# Altium integrated library Samtec 2 mm Pitch Terminal Strips.IntLib: 623 symbols (part 4 of 5) (continued)
## TW-10-03-F-D-200-SM (continued)
SMT Board Stacker, Vertical, -55 to 125 degC, 2 mm Pitch, 20-Pin, Male, RoHS; Manufacturer: Samtec; PartNumber: TW-10-03-F-D-200-SM; Pitch: 2 mm; DatasheetVersion: F-214; PackageVersion: CL, 3/1993; PackageReference: TW-10-03-X-D-200-SM; PackageDescription: High Temp 2mm SMT Board Stacking Terminal Strip ASM; Orientation: Vertical; RoHS: True; Temperature Range: -55 to 125 degC; Mounting Technology: Surface Mount; ComponentLink1Description: Manufacturer URL; ComponentLink1URL: http://www.samtec.com; ComponentLink2Description: Datasheet; ComponentLink2URL: http://d2a072wq521u33.cloudfront.net/catalog_english//TW_SM.PDF; ComponentLink3Description: Package Specification; ComponentLink3URL: http://www.samtec.com/documents/webfiles/cpdf/TW-XX-XX-XXX-X-XXX-SM-XXX-XX-MKT1.pdf
footprint SMTC-TW-10-03-X-D-200-SM (SMT Board Stacking Terminal Strip ASM, 2x10 Pins, Vertical, 2mm Pitch, Male)
pins: 1, 2, 3, 4, 5, 6, 7, 8, 9, 10, 11, 12, 13, 14, 15, 16, 17, 18, 19, 20

## TW-10-03-F-D-236-157
designator P?
Through-Hole Board Stacker, Vertical, -55 to 125 degC, 2 mm Pitch, 20-Pin, Male, RoHS; Manufacturer: Samtec; PartNumber: TW-10-03-F-D-236-157; Pitch: 2 mm; DatasheetVersion: F-214; PackageVersion: BF, 6/1998; PackageReference: TW-10-03-X-D-236-157; PackageDescription: High Temp 2mm Terminal Strip(Board Stacking); Orientation: Vertical; RoHS: True; Temperature Range: -55 to 125 degC; Mounting Technology: Through-hole; ComponentLink1Description: Manufacturer URL; ComponentLink1URL: http://www.samtec.com; ComponentLink2Description: Datasheet; ComponentLink2URL: http://d2a072wq521u33.cloudfront.net/catalog_english//TW_TH.PDF; ComponentLink3Description: Package Specification; ComponentLink3URL: http://www.samtec.com/documents/webfiles/cpdf/TW-XX-XX-X-X-XXX-XXX-XXX-XX-MKT2.pdf
footprint SMTC-TW-10-03-X-D-236-157 (Terminal Strip, 2x10 Pins, Vertical, 2mm Pitch, Male)
pins: 1, 2, 3, 4, 5, 6, 7, 8, 9, 10, 11, 12, 13, 14, 15, 16, 17, 18, 19, 20

## TW-10-03-L-D-200-SM
designator P?
SMT Board Stacker, Vertical, -55 to 125 degC, 2 mm Pitch, 20-Pin, Male, RoHS; Manufacturer: Samtec; PartNumber: TW-10-03-L-D-200-SM; Pitch: 2 mm; DatasheetVersion: F-214; PackageVersion: CL, 3/1993; PackageReference: TW-10-03-X-D-200-SM; PackageDescription: High Temp 2mm SMT Board Stacking Terminal Strip ASM; Orientation: Vertical; RoHS: True; Temperature Range: -55 to 125 degC; Mounting Technology: Surface Mount; ComponentLink1Description: Manufacturer URL; ComponentLink1URL: http://www.samtec.com; ComponentLink2Description: Datasheet; ComponentLink2URL: http://d2a072wq521u33.cloudfront.net/catalog_english//TW_SM.PDF; ComponentLink3Description: Package Specification; ComponentLink3URL: http://www.samtec.com/documents/webfiles/cpdf/TW-XX-XX-XXX-X-XXX-SM-XXX-XX-MKT1.pdf
footprint SMTC-TW-10-03-X-D-200-SM (SMT Board Stacking Terminal Strip ASM, 2x10 Pins, Vertical, 2mm Pitch, Male)
pins: 1, 2, 3, 4, 5, 6, 7, 8, 9, 10, 11, 12, 13, 14, 15, 16, 17, 18, 19, 20

## TW-10-03-L-D-236-157
designator P?
Through-Hole Board Stacker, Vertical, -55 to 125 degC, 2 mm Pitch, 20-Pin, Male, RoHS; Manufacturer: Samtec; PartNumber: TW-10-03-L-D-236-157; Pitch: 2 mm; DatasheetVersion: F-214; PackageVersion: BF, 6/1998; PackageReference: TW-10-03-X-D-236-157; PackageDescription: High Temp 2mm Terminal Strip(Board Stacking); Orientation: Vertical; RoHS: True; Temperature Range: -55 to 125 degC; Mounting Technology: Through-hole; ComponentLink1Description: Manufacturer URL; ComponentLink1URL: http://www.samtec.com; ComponentLink2Description: Datasheet; ComponentLink2URL: http://d2a072wq521u33.cloudfront.net/catalog_english//TW_TH.PDF; ComponentLink3Description: Package Specification; ComponentLink3URL: http://www.samtec.com/documents/webfiles/cpdf/TW-XX-XX-X-X-XXX-XXX-XXX-XX-MKT2.pdf
footprint SMTC-TW-10-03-X-D-236-157 (Terminal Strip, 2x10 Pins, Vertical, 2mm Pitch, Male)
pins: 1, 2, 3, 4, 5, 6, 7, 8, 9, 10, 11, 12, 13, 14, 15, 16, 17, 18, 19, 20

## TW-10-03-T-D-200-SM
designator P?
SMT Board Stacker, Vertical, -55 to 105 degC, 2 mm Pitch, 20-Pin, Male, RoHS; Manufacturer: Samtec; PartNumber: TW-10-03-T-D-200-SM; Pitch: 2 mm; DatasheetVersion: F-214; PackageVersion: CL, 3/1993; PackageReference: TW-10-03-X-D-200-SM; PackageDescription: High Temp 2mm SMT Board Stacking Terminal Strip ASM; Orientation: Vertical; RoHS: True; Temperature Range: -55 to 105 degC; Mounting Technology: Surface Mount; ComponentLink1Description: Manufacturer URL; ComponentLink1URL: http://www.samtec.com; ComponentLink2Description: Datasheet; ComponentLink2URL: http://d2a072wq521u33.cloudfront.net/catalog_english//TW_SM.PDF; ComponentLink3Description: Package Specification; ComponentLink3URL: http://www.samtec.com/documents/webfiles/cpdf/TW-XX-XX-XXX-X-XXX-SM-XXX-XX-MKT1.pdf
footprint SMTC-TW-10-03-X-D-200-SM (SMT Board Stacking Terminal Strip ASM, 2x10 Pins, Vertical, 2mm Pitch, Male)
pins: 1, 2, 3, 4, 5, 6, 7, 8, 9, 10, 11, 12, 13, 14, 15, 16, 17, 18, 19, 20

## TW-10-03-T-D-236-157
designator P?
Through-Hole Board Stacker, Vertical, -55 to 105 degC, 2 mm Pitch, 20-Pin, Male, RoHS; Manufacturer: Samtec; PartNumber: TW-10-03-T-D-236-157; Pitch: 2 mm; DatasheetVersion: F-214; PackageVersion: BF, 6/1998; PackageReference: TW-10-03-X-D-236-157; PackageDescription: High Temp 2mm Terminal Strip(Board Stacking); Orientation: Vertical; RoHS: True; Temperature Range: -55 to 105 degC; Mounting Technology: Through-hole; ComponentLink1Description: Manufacturer URL; ComponentLink1URL: http://www.samtec.com; ComponentLink2Description: Datasheet; ComponentLink2URL: http://d2a072wq521u33.cloudfront.net/catalog_english//TW_TH.PDF; ComponentLink3Description: Package Specification; ComponentLink3URL: http://www.samtec.com/documents/webfiles/cpdf/TW-XX-XX-X-X-XXX-XXX-XXX-XX-MKT2.pdf
footprint SMTC-TW-10-03-X-D-236-157 (Terminal Strip, 2x10 Pins, Vertical, 2mm Pitch, Male)
pins: 1, 2, 3, 4, 5, 6, 7, 8, 9, 10, 11, 12, 13, 14, 15, 16, 17, 18, 19, 20

## TW-10-06-F-Q-370-105
designator P?
Through-Hole Board Stacker, Vertical, -55 to 125 degC, 2 mm Pitch, 40-Pin, Male, RoHS; Manufacturer: Samtec; PartNumber: TW-10-06-F-Q-370-105; Pitch: 2 mm; DatasheetVersion: F-214; PackageVersion: BF, 6/1998; PackageReference: TW-10-06-X-Q-370-105; PackageDescription: High Temp 2mm Terminal Strip(Board Stacking); Orientation: Vertical; RoHS: True; Temperature Range: -55 to 125 degC; Mounting Technology: Through-hole; ComponentLink1Description: Manufacturer URL; ComponentLink1URL: http://www.samtec.com; ComponentLink2Description: Datasheet; ComponentLink2URL: http://d2a072wq521u33.cloudfront.net/catalog_english//TW_TH.PDF; ComponentLink3Description: Package Specification; ComponentLink3URL: http://www.samtec.com/documents/webfiles/cpdf/TW-XX-XX-X-X-XXX-XXX-XXX-XX-MKT2.pdf
footprint SMTC-TW-10-06-X-Q-370-105 (Terminal Strip, 4x10 Pins, Vertical, 2mm Pitch, Male)
pins: 1, 2, 3, 4, 5, 6, 7, 8, 9, 10, 11, 12, 13, 14, 15, 16, 17, 18, 19, 20, 21, 22, 23, 24, 25, 26, 27, 28, 29, 30, 31, 32, 33, 34, 35, 36, 37, 38, 39, 40

## TW-10-06-L-Q-370-105
designator P?
Through-Hole Board Stacker, Vertical, -55 to 125 degC, 2 mm Pitch, 40-Pin, Male, RoHS; Manufacturer: Samtec; PartNumber: TW-10-06-L-Q-370-105; Pitch: 2 mm; DatasheetVersion: F-214; PackageVersion: BF, 6/1998; PackageReference: TW-10-06-X-Q-370-105; PackageDescription: High Temp 2mm Terminal Strip(Board Stacking); Orientation: Vertical; RoHS: True; Temperature Range: -55 to 125 degC; Mounting Technology: Through-hole; ComponentLink1Description: Manufacturer URL; ComponentLink1URL: http://www.samtec.com; ComponentLink2Description: Datasheet; ComponentLink2URL: http://d2a072wq521u33.cloudfront.net/catalog_english//TW_TH.PDF; ComponentLink3Description: Package Specification; ComponentLink3URL: http://www.samtec.com/documents/webfiles/cpdf/TW-XX-XX-X-X-XXX-XXX-XXX-XX-MKT2.pdf
footprint SMTC-TW-10-06-X-Q-370-105 (Terminal Strip, 4x10 Pins, Vertical, 2mm Pitch, Male)
pins: 1, 2, 3, 4, 5, 6, 7, 8, 9, 10, 11, 12, 13, 14, 15, 16, 17, 18, 19, 20, 21, 22, 23, 24, 25, 26, 27, 28, 29, 30, 31, 32, 33, 34, 35, 36, 37, 38, 39, 40

## TW-10-06-T-Q-370-105
designator P?
Through-Hole Board Stacker, Vertical, -55 to 105 degC, 2 mm Pitch, 40-Pin, Male, RoHS; Manufacturer: Samtec; PartNumber: TW-10-06-T-Q-370-105; Pitch: 2 mm; DatasheetVersion: F-214; PackageVersion: BF, 6/1998; PackageReference: TW-10-06-X-Q-370-105; PackageDescription: High Temp 2mm Terminal Strip(Board Stacking); Orientation: Vertical; RoHS: True; Temperature Range: -55 to 105 degC; Mounting Technology: Through-hole; ComponentLink1Description: Manufacturer URL; ComponentLink1URL: http://www.samtec.com; ComponentLink2Description: Datasheet; ComponentLink2URL: http://d2a072wq521u33.cloudfront.net/catalog_english//TW_TH.PDF; ComponentLink3Description: Package Specification; ComponentLink3URL: http://www.samtec.com/documents/webfiles/cpdf/TW-XX-XX-X-X-XXX-XXX-XXX-XX-MKT2.pdf
footprint SMTC-TW-10-06-X-Q-370-105 (Terminal Strip, 4x10 Pins, Vertical, 2mm Pitch, Male)
pins: 1, 2, 3, 4, 5, 6, 7, 8, 9, 10, 11, 12, 13, 14, 15, 16, 17, 18, 19, 20, 21, 22, 23, 24, 25, 26, 27, 28, 29, 30, 31, 32, 33, 34, 35, 36, 37, 38, 39, 40

## TW-10-09-F-6-160-100
designator P?
Through-Hole Board Stacker, Vertical, -55 to 125 degC, 2 mm Pitch, 60-Pin, Male, RoHS; Manufacturer: Samtec; PartNumber: TW-10-09-F-6-160-100; Pitch: 2 mm; DatasheetVersion: F-214; PackageVersion: BF, 6/1998; PackageReference: TW-10-09-X-6-160-100; PackageDescription: High Temp 2mm Terminal Strip(Board Stacking); Orientation: Vertical; RoHS: True; Temperature Range: -55 to 125 degC; Mounting Technology: Through-hole; ComponentLink1Description: Manufacturer URL; ComponentLink1URL: http://www.samtec.com; ComponentLink2Description: Datasheet; ComponentLink2URL: http://d2a072wq521u33.cloudfront.net/catalog_english//TW_TH.PDF; ComponentLink3Description: Package Specification; ComponentLink3URL: http://www.samtec.com/documents/webfiles/cpdf/TW-XX-XX-X-X-XXX-XXX-XXX-XX-MKT2.pdf
footprint SMTC-TW-10-09-X-6-160-100 (Terminal Strip, 6x10 Pins, Vertical, 2mm Pitch, Male)
pins: 1, 2, 3, 4, 5, 6, 7, 8, 9, 10, 11, 12, 13, 14, 15, 16, 17, 18, 19, 20, 21, 22, 23, 24, 25, 26, 27, 28, 29, 30, 31, 32, 33, 34, 35, 36, 37, 38, 39, 40, 41, 42, 43, 44, 45, 46, 47, 48, 49, 50, 51, 52, 53, 54, 55, 56, 57, 58, 59, 60

## TW-10-09-F-D-260-SM-P
designator P?
SMT Board Stacker, Vertical, -55 to 125 degC, 2 mm Pitch, 20-Pin, Male, RoHS; Manufacturer: Samtec; PartNumber: TW-10-09-F-D-260-SM-P; Pitch: 2 mm; DatasheetVersion: F-214; PackageVersion: CL, 3/1993; PackageReference: TW-10-09-X-D-260-SM-P; PackageDescription: High Temp 2mm SMT Board Stacking Terminal Strip ASM; Orientation: Vertical; RoHS: True; Temperature Range: -55 to 125 degC; Mounting Technology: Surface Mount; ComponentLink1Description: Manufacturer URL; ComponentLink1URL: http://www.samtec.com; ComponentLink2Description: Datasheet; ComponentLink2URL: http://d2a072wq521u33.cloudfront.net/catalog_english//TW_SM.PDF; ComponentLink3Description: Package Specification; ComponentLink3URL: http://www.samtec.com/documents/webfiles/cpdf/TW-XX-XX-XXX-X-XXX-SM-XXX-XX-MKT1.pdf
footprint SMTC-TW-10-09-X-D-260-SM-P (SMT Board Stacking Terminal Strip ASM, 2x10 Pins, Vertical, 2mm Pitch, Male)
pins: 1, 2, 3, 4, 5, 6, 7, 8, 9, 10, 11, 12, 13, 14, 15, 16, 17, 18, 19, 20

## TW-10-09-L-6-160-100
designator P?
Through-Hole Board Stacker, Vertical, -55 to 125 degC, 2 mm Pitch, 60-Pin, Male, RoHS; Manufacturer: Samtec; PartNumber: TW-10-09-L-6-160-100; Pitch: 2 mm; DatasheetVersion: F-214; PackageVersion: BF, 6/1998; PackageReference: TW-10-09-X-6-160-100; PackageDescription: High Temp 2mm Terminal Strip(Board Stacking); Orientation: Vertical; RoHS: True; Temperature Range: -55 to 125 degC; Mounting Technology: Through-hole; ComponentLink1Description: Manufacturer URL; ComponentLink1URL: http://www.samtec.com; ComponentLink2Description: Datasheet; ComponentLink2URL: http://d2a072wq521u33.cloudfront.net/catalog_english//TW_TH.PDF; ComponentLink3Description: Package Specification; ComponentLink3URL: http://www.samtec.com/documents/webfiles/cpdf/TW-XX-XX-X-X-XXX-XXX-XXX-XX-MKT2.pdf
footprint SMTC-TW-10-09-X-6-160-100 (Terminal Strip, 6x10 Pins, Vertical, 2mm Pitch, Male)
pins: 1, 2, 3, 4, 5, 6, 7, 8, 9, 10, 11, 12, 13, 14, 15, 16, 17, 18, 19, 20, 21, 22, 23, 24, 25, 26, 27, 28, 29, 30, 31, 32, 33, 34, 35, 36, 37, 38, 39, 40, 41, 42, 43, 44, 45, 46, 47, 48, 49, 50, 51, 52, 53, 54, 55, 56, 57, 58, 59, 60

## TW-10-09-L-D-260-SM-P
designator P?
SMT Board Stacker, Vertical, -55 to 125 degC, 2 mm Pitch, 20-Pin, Male, RoHS; Manufacturer: Samtec; PartNumber: TW-10-09-L-D-260-SM-P; Pitch: 2 mm; DatasheetVersion: F-214; PackageVersion: CL, 3/1993; PackageReference: TW-10-09-X-D-260-SM-P; PackageDescription: High Temp 2mm SMT Board Stacking Terminal Strip ASM; Orientation: Vertical; RoHS: True; Temperature Range: -55 to 125 degC; Mounting Technology: Surface Mount; ComponentLink1Description: Manufacturer URL; ComponentLink1URL: http://www.samtec.com; ComponentLink2Description: Datasheet; ComponentLink2URL: http://d2a072wq521u33.cloudfront.net/catalog_english//TW_SM.PDF; ComponentLink3Description: Package Specification; ComponentLink3URL: http://www.samtec.com/documents/webfiles/cpdf/TW-XX-XX-XXX-X-XXX-SM-XXX-XX-MKT1.pdf
footprint SMTC-TW-10-09-X-D-260-SM-P (SMT Board Stacking Terminal Strip ASM, 2x10 Pins, Vertical, 2mm Pitch, Male)
pins: 1, 2, 3, 4, 5, 6, 7, 8, 9, 10, 11, 12, 13, 14, 15, 16, 17, 18, 19, 20

## TW-10-09-T-6-160-100
designator P?
Through-Hole Board Stacker, Vertical, -55 to 105 degC, 2 mm Pitch, 60-Pin, Male, RoHS; Manufacturer: Samtec; PartNumber: TW-10-09-T-6-160-100; Pitch: 2 mm; DatasheetVersion: F-214; PackageVersion: BF, 6/1998; PackageReference: TW-10-09-X-6-160-100; PackageDescription: High Temp 2mm Terminal Strip(Board Stacking); Orientation: Vertical; RoHS: True; Temperature Range: -55 to 105 degC; Mounting Technology: Through-hole; ComponentLink1Description: Manufacturer URL; ComponentLink1URL: http://www.samtec.com; ComponentLink2Description: Datasheet; ComponentLink2URL: http://d2a072wq521u33.cloudfront.net/catalog_english//TW_TH.PDF; ComponentLink3Description: Package Specification; ComponentLink3URL: http://www.samtec.com/documents/webfiles/cpdf/TW-XX-XX-X-X-XXX-XXX-XXX-XX-MKT2.pdf
footprint SMTC-TW-10-09-X-6-160-100 (Terminal Strip, 6x10 Pins, Vertical, 2mm Pitch, Male)
pins: 1, 2, 3, 4, 5, 6, 7, 8, 9, 10, 11, 12, 13, 14, 15, 16, 17, 18, 19, 20, 21, 22, 23, 24, 25, 26, 27, 28, 29, 30, 31, 32, 33, 34, 35, 36, 37, 38, 39, 40, 41, 42, 43, 44, 45, 46, 47, 48, 49, 50, 51, 52, 53, 54, 55, 56, 57, 58, 59, 60

## TW-10-09-T-D-260-SM-P
designator P?
SMT Board Stacker, Vertical, -55 to 105 degC, 2 mm Pitch, 20-Pin, Male, RoHS; Manufacturer: Samtec; PartNumber: TW-10-09-T-D-260-SM-P; Pitch: 2 mm; DatasheetVersion: F-214; PackageVersion: CL, 3/1993; PackageReference: TW-10-09-X-D-260-SM-P; PackageDescription: High Temp 2mm SMT Board Stacking Terminal Strip ASM; Orientation: Vertical; RoHS: True; Temperature Range: -55 to 105 degC; Mounting Technology: Surface Mount; ComponentLink1Description: Manufacturer URL; ComponentLink1URL: http://www.samtec.com; ComponentLink2Description: Datasheet; ComponentLink2URL: http://d2a072wq521u33.cloudfront.net/catalog_english//TW_SM.PDF; ComponentLink3Description: Package Specification; ComponentLink3URL: http://www.samtec.com/documents/webfiles/cpdf/TW-XX-XX-XXX-X-XXX-SM-XXX-XX-MKT1.pdf
footprint SMTC-TW-10-09-X-D-260-SM-P (SMT Board Stacking Terminal Strip ASM, 2x10 Pins, Vertical, 2mm Pitch, Male)
pins: 1, 2, 3, 4, 5, 6, 7, 8, 9, 10, 11, 12, 13, 14, 15, 16, 17, 18, 19, 20

## TW-10-10-F-D-355-195
designator P?
Through-Hole Board Stacker, Vertical, -55 to 125 degC, 2 mm Pitch, 20-Pin, Male, RoHS; Manufacturer: Samtec; PartNumber: TW-10-10-F-D-355-195; Pitch: 2 mm; DatasheetVersion: F-214; PackageVersion: BF, 6/1998; PackageReference: TW-10-10-X-D-355-195; PackageDescription: High Temp 2mm Terminal Strip(Board Stacking); Orientation: Vertical; RoHS: True; Temperature Range: -55 to 125 degC; Mounting Technology: Through-hole; ComponentLink1Description: Manufacturer URL; ComponentLink1URL: http://www.samtec.com; ComponentLink2Description: Datasheet; ComponentLink2URL: http://d2a072wq521u33.cloudfront.net/catalog_english//TW_TH.PDF; ComponentLink3Description: Package Specification; ComponentLink3URL: http://www.samtec.com/documents/webfiles/cpdf/TW-XX-XX-X-X-XXX-XXX-XXX-XX-MKT2.pdf
footprint SMTC-TW-10-10-X-D-355-195 (Terminal Strip, 2x10 Pins, Vertical, 2mm Pitch, Male)
pins: 1, 2, 3, 4, 5, 6, 7, 8, 9, 10, 11, 12, 13, 14, 15, 16, 17, 18, 19, 20

## TW-10-10-L-D-355-195
designator P?
Through-Hole Board Stacker, Vertical, -55 to 125 degC, 2 mm Pitch, 20-Pin, Male, RoHS; Manufacturer: Samtec; PartNumber: TW-10-10-L-D-355-195; Pitch: 2 mm; DatasheetVersion: F-214; PackageVersion: BF, 6/1998; PackageReference: TW-10-10-X-D-355-195; PackageDescription: High Temp 2mm Terminal Strip(Board Stacking); Orientation: Vertical; RoHS: True; Temperature Range: -55 to 125 degC; Mounting Technology: Through-hole; ComponentLink1Description: Manufacturer URL; ComponentLink1URL: http://www.samtec.com; ComponentLink2Description: Datasheet; ComponentLink2URL: http://d2a072wq521u33.cloudfront.net/catalog_english//TW_TH.PDF; ComponentLink3Description: Package Specification; ComponentLink3URL: http://www.samtec.com/documents/webfiles/cpdf/TW-XX-XX-X-X-XXX-XXX-XXX-XX-MKT2.pdf
footprint SMTC-TW-10-10-X-D-355-195 (Terminal Strip, 2x10 Pins, Vertical, 2mm Pitch, Male)
pins: 1, 2, 3, 4, 5, 6, 7, 8, 9, 10, 11, 12, 13, 14, 15, 16, 17, 18, 19, 20

## TW-10-10-T-D-355-195
designator P?
Through-Hole Board Stacker, Vertical, -55 to 105 degC, 2 mm Pitch, 20-Pin, Male, RoHS; Manufacturer: Samtec; PartNumber: TW-10-10-T-D-355-195; Pitch: 2 mm; DatasheetVersion: F-214; PackageVersion: BF, 6/1998; PackageReference: TW-10-10-X-D-355-195; PackageDescription: High Temp 2mm Terminal Strip(Board Stacking); Orientation: Vertical; RoHS: True; Temperature Range: -55 to 105 degC; Mounting Technology: Through-hole; ComponentLink1Description: Manufacturer URL; ComponentLink1URL: http://www.samtec.com; ComponentLink2Description: Datasheet; ComponentLink2URL: http://d2a072wq521u33.cloudfront.net/catalog_english//TW_TH.PDF; ComponentLink3Description: Package Specification; ComponentLink3URL: http://www.samtec.com/documents/webfiles/cpdf/TW-XX-XX-X-X-XXX-XXX-XXX-XX-MKT2.pdf
footprint SMTC-TW-10-10-X-D-355-195 (Terminal Strip, 2x10 Pins, Vertical, 2mm Pitch, Male)
pins: 1, 2, 3, 4, 5, 6, 7, 8, 9, 10, 11, 12, 13, 14, 15, 16, 17, 18, 19, 20

## TW-10-12-F-D-830-090
designator P?
Through-Hole Board Stacker, Vertical, -55 to 125 degC, 2 mm Pitch, 20-Pin, Male, RoHS; Manufacturer: Samtec; PartNumber: TW-10-12-F-D-830-090; Pitch: 2 mm; DatasheetVersion: F-214; PackageVersion: BF, 6/1998; PackageReference: TW-10-12-X-D-830-090; PackageDescription: High Temp 2mm Terminal Strip(Board Stacking); Orientation: Vertical; RoHS: True; Temperature Range: -55 to 125 degC; Mounting Technology: Through-hole; ComponentLink1Description: Manufacturer URL; ComponentLink1URL: http://www.samtec.com; ComponentLink2Description: Datasheet; ComponentLink2URL: http://d2a072wq521u33.cloudfront.net/catalog_english//TW_TH.PDF; ComponentLink3Description: Package Specification; ComponentLink3URL: http://www.samtec.com/documents/webfiles/cpdf/TW-XX-XX-X-X-XXX-XXX-XXX-XX-MKT2.pdf
footprint SMTC-TW-10-12-X-D-830-090 (Terminal Strip, 2x10 Pins, Vertical, 2mm Pitch, Male)
pins: 1, 2, 3, 4, 5, 6, 7, 8, 9, 10, 11, 12, 13, 14, 15, 16, 17, 18, 19, 20

## TW-10-12-F-D-840-090
designator P?
Through-Hole Board Stacker, Vertical, -55 to 125 degC, 2 mm Pitch, 20-Pin, Male, RoHS; Manufacturer: Samtec; PartNumber: TW-10-12-F-D-840-090; Pitch: 2 mm; DatasheetVersion: F-214; PackageVersion: BF, 6/1998; PackageReference: TW-10-12-X-D-840-090; PackageDescription: High Temp 2mm Terminal Strip(Board Stacking); Orientation: Vertical; RoHS: True; Temperature Range: -55 to 125 degC; Mounting Technology: Through-hole; ComponentLink1Description: Manufacturer URL; ComponentLink1URL: http://www.samtec.com; ComponentLink2Description: Datasheet; ComponentLink2URL: http://d2a072wq521u33.cloudfront.net/catalog_english//TW_TH.PDF; ComponentLink3Description: Package Specification; ComponentLink3URL: http://www.samtec.com/documents/webfiles/cpdf/TW-XX-XX-X-X-XXX-XXX-XXX-XX-MKT2.pdf
footprint SMTC-TW-10-12-X-D-840-090 (Terminal Strip, 2x10 Pins, Vertical, 2mm Pitch, Male)
pins: 1, 2, 3, 4, 5, 6, 7, 8, 9, 10, 11, 12, 13, 14, 15, 16, 17, 18, 19, 20

## TW-10-12-L-D-830-090
designator P?
Through-Hole Board Stacker, Vertical, -55 to 125 degC, 2 mm Pitch, 20-Pin, Male, RoHS; Manufacturer: Samtec; PartNumber: TW-10-12-L-D-830-090; Pitch: 2 mm; DatasheetVersion: F-214; PackageVersion: BF, 6/1998; PackageReference: TW-10-12-X-D-830-090; PackageDescription: High Temp 2mm Terminal Strip(Board Stacking); Orientation: Vertical; RoHS: True; Temperature Range: -55 to 125 degC; Mounting Technology: Through-hole; ComponentLink1Description: Manufacturer URL; ComponentLink1URL: http://www.samtec.com; ComponentLink2Description: Datasheet; ComponentLink2URL: http://d2a072wq521u33.cloudfront.net/catalog_english//TW_TH.PDF; ComponentLink3Description: Package Specification; ComponentLink3URL: http://www.samtec.com/documents/webfiles/cpdf/TW-XX-XX-X-X-XXX-XXX-XXX-XX-MKT2.pdf
footprint SMTC-TW-10-12-X-D-830-090 (Terminal Strip, 2x10 Pins, Vertical, 2mm Pitch, Male)
pins: 1, 2, 3, 4, 5, 6, 7, 8, 9, 10, 11, 12, 13, 14, 15, 16, 17, 18, 19, 20

## TW-10-12-L-D-840-090
designator P?
Through-Hole Board Stacker, Vertical, -55 to 125 degC, 2 mm Pitch, 20-Pin, Male, RoHS; Manufacturer: Samtec; PartNumber: TW-10-12-L-D-840-090; Pitch: 2 mm; DatasheetVersion: F-214; PackageVersion: BF, 6/1998; PackageReference: TW-10-12-X-D-840-090; PackageDescription: High Temp 2mm Terminal Strip(Board Stacking); Orientation: Vertical; RoHS: True; Temperature Range: -55 to 125 degC; Mounting Technology: Through-hole; ComponentLink1Description: Manufacturer URL; ComponentLink1URL: http://www.samtec.com; ComponentLink2Description: Datasheet; ComponentLink2URL: http://d2a072wq521u33.cloudfront.net/catalog_english//TW_TH.PDF; ComponentLink3Description: Package Specification; ComponentLink3URL: http://www.samtec.com/documents/webfiles/cpdf/TW-XX-XX-X-X-XXX-XXX-XXX-XX-MKT2.pdf
footprint SMTC-TW-10-12-X-D-840-090 (Terminal Strip, 2x10 Pins, Vertical, 2mm Pitch, Male)
pins: 1, 2, 3, 4, 5, 6, 7, 8, 9, 10, 11, 12, 13, 14, 15, 16, 17, 18, 19, 20

## TW-10-12-T-D-830-090
designator P?
Through-Hole Board Stacker, Vertical, -55 to 105 degC, 2 mm Pitch, 20-Pin, Male, RoHS; Manufacturer: Samtec; PartNumber: TW-10-12-T-D-830-090; Pitch: 2 mm; DatasheetVersion: F-214; PackageVersion: BF, 6/1998; PackageReference: TW-10-12-X-D-830-090; PackageDescription: High Temp 2mm Terminal Strip(Board Stacking); Orientation: Vertical; RoHS: True; Temperature Range: -55 to 105 degC; Mounting Technology: Through-hole; ComponentLink1Description: Manufacturer URL; ComponentLink1URL: http://www.samtec.com; ComponentLink2Description: Datasheet; ComponentLink2URL: http://d2a072wq521u33.cloudfront.net/catalog_english//TW_TH.PDF; ComponentLink3Description: Package Specification; ComponentLink3URL: http://www.samtec.com/documents/webfiles/cpdf/TW-XX-XX-X-X-XXX-XXX-XXX-XX-MKT2.pdf
footprint SMTC-TW-10-12-X-D-830-090 (Terminal Strip, 2x10 Pins, Vertical, 2mm Pitch, Male)
pins: 1, 2, 3, 4, 5, 6, 7, 8, 9, 10, 11, 12, 13, 14, 15, 16, 17, 18, 19, 20

## TW-10-12-T-D-840-090
designator P?
Through-Hole Board Stacker, Vertical, -55 to 105 degC, 2 mm Pitch, 20-Pin, Male, RoHS; Manufacturer: Samtec; PartNumber: TW-10-12-T-D-840-090; Pitch: 2 mm; DatasheetVersion: F-214; PackageVersion: BF, 6/1998; PackageReference: TW-10-12-X-D-840-090; PackageDescription: High Temp 2mm Terminal Strip(Board Stacking); Orientation: Vertical; RoHS: True; Temperature Range: -55 to 105 degC; Mounting Technology: Through-hole; ComponentLink1Description: Manufacturer URL; ComponentLink1URL: http://www.samtec.com; ComponentLink2Description: Datasheet; ComponentLink2URL: http://d2a072wq521u33.cloudfront.net/catalog_english//TW_TH.PDF; ComponentLink3Description: Package Specification; ComponentLink3URL: http://www.samtec.com/documents/webfiles/cpdf/TW-XX-XX-X-X-XXX-XXX-XXX-XX-MKT2.pdf
footprint SMTC-TW-10-12-X-D-840-090 (Terminal Strip, 2x10 Pins, Vertical, 2mm Pitch, Male)
pins: 1, 2, 3, 4, 5, 6, 7, 8, 9, 10, 11, 12, 13, 14, 15, 16, 17, 18, 19, 20

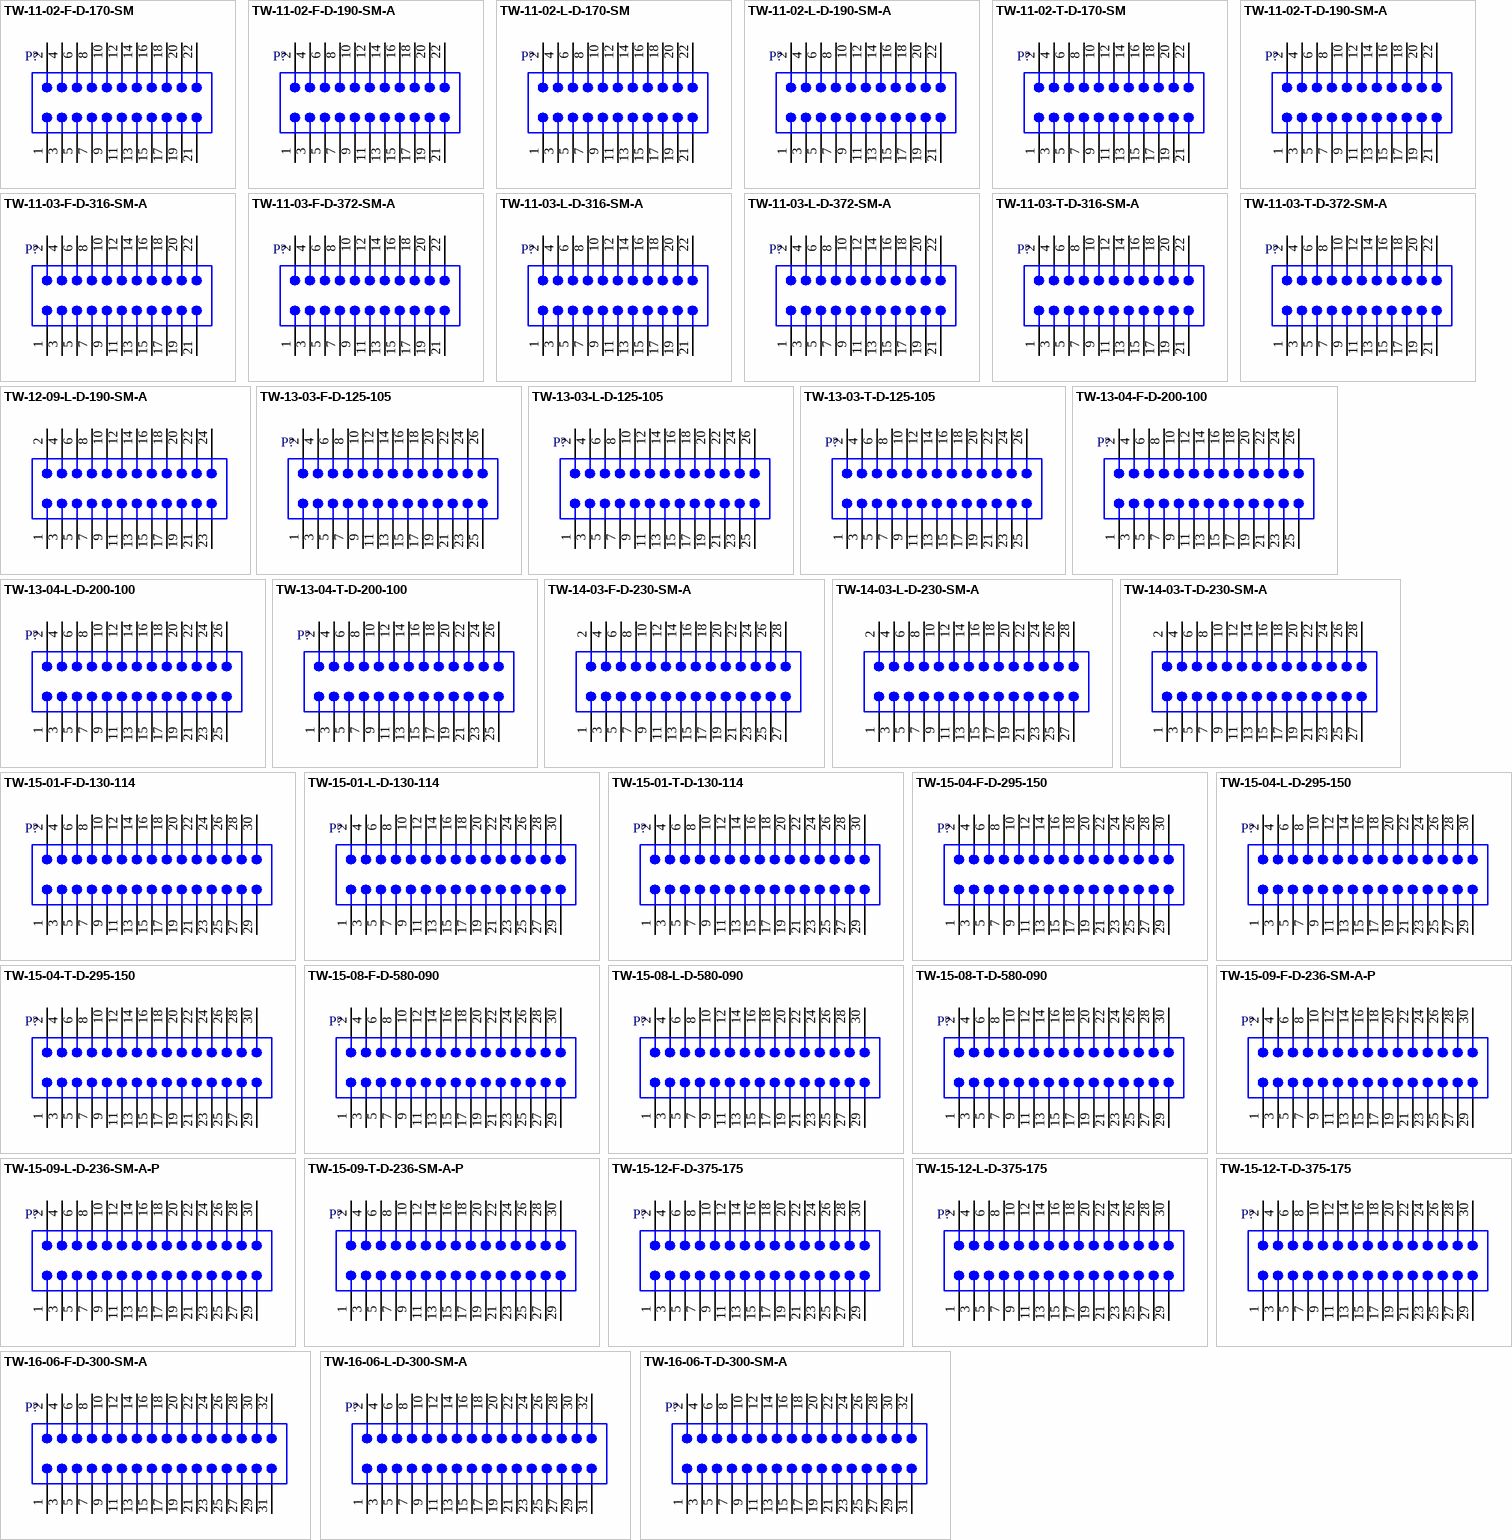
[diagram p14: symbols TW-11-02-F-D-170-SM to TW-16-06-T-D-300-SM-A]

## TW-11-02-F-D-170-SM
designator P?
SMT Board Stacker, Vertical, -55 to 125 degC, 2 mm Pitch, 22-Pin, Male, RoHS; Manufacturer: Samtec; PartNumber: TW-11-02-F-D-170-SM; Pitch: 2 mm; DatasheetVersion: F-214; PackageVersion: CL, 3/1993; PackageReference: TW-11-02-X-D-170-SM; PackageDescription: High Temp 2mm SMT Board Stacking Terminal Strip ASM; Orientation: Vertical; RoHS: True; Temperature Range: -55 to 125 degC; Mounting Technology: Surface Mount; ComponentLink1Description: Manufacturer URL; ComponentLink1URL: http://www.samtec.com; ComponentLink2Description: Datasheet; ComponentLink2URL: http://d2a072wq521u33.cloudfront.net/catalog_english//TW_SM.PDF; ComponentLink3Description: Package Specification; ComponentLink3URL: http://www.samtec.com/documents/webfiles/cpdf/TW-XX-XX-XXX-X-XXX-SM-XXX-XX-MKT1.pdf
footprint SMTC-TW-11-02-X-D-170-SM (SMT Board Stacking Terminal Strip ASM, 2x11 Pins, Vertical, 2mm Pitch, Male)
pins: 1, 2, 3, 4, 5, 6, 7, 8, 9, 10, 11, 12, 13, 14, 15, 16, 17, 18, 19, 20, 21, 22

## TW-11-02-F-D-190-SM-A
designator P?
SMT Board Stacker, Vertical, -55 to 125 degC, 2 mm Pitch, 22-Pin, Male, RoHS; Manufacturer: Samtec; PartNumber: TW-11-02-F-D-190-SM-A; Pitch: 2 mm; DatasheetVersion: F-214; PackageVersion: CL, 3/1993; PackageReference: TW-11-02-X-D-190-SM-A; PackageDescription: High Temp 2mm SMT Board Stacking Terminal Strip ASM; Orientation: Vertical; RoHS: True; Temperature Range: -55 to 125 degC; Mounting Technology: Surface Mount; ComponentLink1Description: Manufacturer URL; ComponentLink1URL: http://www.samtec.com; ComponentLink2Description: Datasheet; ComponentLink2URL: http://d2a072wq521u33.cloudfront.net/catalog_english//TW_SM.PDF; ComponentLink3Description: Package Specification; ComponentLink3URL: http://www.samtec.com/documents/webfiles/cpdf/TW-XX-XX-XXX-X-XXX-SM-XXX-XX-MKT1.pdf
footprint SMTC-TW-11-02-X-D-190-SM-A (SMT Board Stacking Terminal Strip ASM, 2x11 Pins, Vertical, 2mm Pitch, Male)
pins: 1, 2, 3, 4, 5, 6, 7, 8, 9, 10, 11, 12, 13, 14, 15, 16, 17, 18, 19, 20, 21, 22

## TW-11-02-L-D-170-SM
designator P?
SMT Board Stacker, Vertical, -55 to 125 degC, 2 mm Pitch, 22-Pin, Male, RoHS; Manufacturer: Samtec; PartNumber: TW-11-02-L-D-170-SM; Pitch: 2 mm; DatasheetVersion: F-214; PackageVersion: CL, 3/1993; PackageReference: TW-11-02-X-D-170-SM; PackageDescription: High Temp 2mm SMT Board Stacking Terminal Strip ASM; Orientation: Vertical; RoHS: True; Temperature Range: -55 to 125 degC; Mounting Technology: Surface Mount; ComponentLink1Description: Manufacturer URL; ComponentLink1URL: http://www.samtec.com; ComponentLink2Description: Datasheet; ComponentLink2URL: http://d2a072wq521u33.cloudfront.net/catalog_english//TW_SM.PDF; ComponentLink3Description: Package Specification; ComponentLink3URL: http://www.samtec.com/documents/webfiles/cpdf/TW-XX-XX-XXX-X-XXX-SM-XXX-XX-MKT1.pdf
footprint SMTC-TW-11-02-X-D-170-SM (SMT Board Stacking Terminal Strip ASM, 2x11 Pins, Vertical, 2mm Pitch, Male)
pins: 1, 2, 3, 4, 5, 6, 7, 8, 9, 10, 11, 12, 13, 14, 15, 16, 17, 18, 19, 20, 21, 22

## TW-11-02-L-D-190-SM-A
designator P?
SMT Board Stacker, Vertical, -55 to 125 degC, 2 mm Pitch, 22-Pin, Male, RoHS; Manufacturer: Samtec; PartNumber: TW-11-02-L-D-190-SM-A; Pitch: 2 mm; DatasheetVersion: F-214; PackageVersion: CL, 3/1993; PackageReference: TW-11-02-X-D-190-SM-A; PackageDescription: High Temp 2mm SMT Board Stacking Terminal Strip ASM; Orientation: Vertical; RoHS: True; Temperature Range: -55 to 125 degC; Mounting Technology: Surface Mount; ComponentLink1Description: Manufacturer URL; ComponentLink1URL: http://www.samtec.com; ComponentLink2Description: Datasheet; ComponentLink2URL: http://d2a072wq521u33.cloudfront.net/catalog_english//TW_SM.PDF; ComponentLink3Description: Package Specification; ComponentLink3URL: http://www.samtec.com/documents/webfiles/cpdf/TW-XX-XX-XXX-X-XXX-SM-XXX-XX-MKT1.pdf
footprint SMTC-TW-11-02-X-D-190-SM-A (SMT Board Stacking Terminal Strip ASM, 2x11 Pins, Vertical, 2mm Pitch, Male)
pins: 1, 2, 3, 4, 5, 6, 7, 8, 9, 10, 11, 12, 13, 14, 15, 16, 17, 18, 19, 20, 21, 22

## TW-11-02-T-D-170-SM
designator P?
SMT Board Stacker, Vertical, -55 to 105 degC, 2 mm Pitch, 22-Pin, Male, RoHS; Manufacturer: Samtec; PartNumber: TW-11-02-T-D-170-SM; Pitch: 2 mm; DatasheetVersion: F-214; PackageVersion: CL, 3/1993; PackageReference: TW-11-02-X-D-170-SM; PackageDescription: High Temp 2mm SMT Board Stacking Terminal Strip ASM; Orientation: Vertical; RoHS: True; Temperature Range: -55 to 105 degC; Mounting Technology: Surface Mount; ComponentLink1Description: Manufacturer URL; ComponentLink1URL: http://www.samtec.com; ComponentLink2Description: Datasheet; ComponentLink2URL: http://d2a072wq521u33.cloudfront.net/catalog_english//TW_SM.PDF; ComponentLink3Description: Package Specification; ComponentLink3URL: http://www.samtec.com/documents/webfiles/cpdf/TW-XX-XX-XXX-X-XXX-SM-XXX-XX-MKT1.pdf
footprint SMTC-TW-11-02-X-D-170-SM (SMT Board Stacking Terminal Strip ASM, 2x11 Pins, Vertical, 2mm Pitch, Male)
pins: 1, 2, 3, 4, 5, 6, 7, 8, 9, 10, 11, 12, 13, 14, 15, 16, 17, 18, 19, 20, 21, 22

## TW-11-02-T-D-190-SM-A
designator P?
SMT Board Stacker, Vertical, -55 to 105 degC, 2 mm Pitch, 22-Pin, Male, RoHS; Manufacturer: Samtec; PartNumber: TW-11-02-T-D-190-SM-A; Pitch: 2 mm; DatasheetVersion: F-214; PackageVersion: CL, 3/1993; PackageReference: TW-11-02-X-D-190-SM-A; PackageDescription: High Temp 2mm SMT Board Stacking Terminal Strip ASM; Orientation: Vertical; RoHS: True; Temperature Range: -55 to 105 degC; Mounting Technology: Surface Mount; ComponentLink1Description: Manufacturer URL; ComponentLink1URL: http://www.samtec.com; ComponentLink2Description: Datasheet; ComponentLink2URL: http://d2a072wq521u33.cloudfront.net/catalog_english//TW_SM.PDF; ComponentLink3Description: Package Specification; ComponentLink3URL: http://www.samtec.com/documents/webfiles/cpdf/TW-XX-XX-XXX-X-XXX-SM-XXX-XX-MKT1.pdf
footprint SMTC-TW-11-02-X-D-190-SM-A (SMT Board Stacking Terminal Strip ASM, 2x11 Pins, Vertical, 2mm Pitch, Male)
pins: 1, 2, 3, 4, 5, 6, 7, 8, 9, 10, 11, 12, 13, 14, 15, 16, 17, 18, 19, 20, 21, 22

## TW-11-03-F-D-316-SM-A
designator P?
SMT Board Stacker, Vertical, -55 to 125 degC, 2 mm Pitch, 22-Pin, Male, RoHS; Manufacturer: Samtec; PartNumber: TW-11-03-F-D-316-SM-A; Pitch: 2 mm; DatasheetVersion: F-214; PackageVersion: CL, 3/1993; PackageReference: TW-11-03-X-D-316-SM-A; PackageDescription: High Temp 2mm SMT Board Stacking Terminal Strip ASM; Orientation: Vertical; RoHS: True; Temperature Range: -55 to 125 degC; Mounting Technology: Surface Mount; ComponentLink1Description: Manufacturer URL; ComponentLink1URL: http://www.samtec.com; ComponentLink2Description: Datasheet; ComponentLink2URL: http://d2a072wq521u33.cloudfront.net/catalog_english//TW_SM.PDF; ComponentLink3Description: Package Specification; ComponentLink3URL: http://www.samtec.com/documents/webfiles/cpdf/TW-XX-XX-XXX-X-XXX-SM-XXX-XX-MKT1.pdf
footprint SMTC-TW-11-03-X-D-316-SM-A (SMT Board Stacking Terminal Strip ASM, 2x11 Pins, Vertical, 2mm Pitch, Male)
pins: 1, 2, 3, 4, 5, 6, 7, 8, 9, 10, 11, 12, 13, 14, 15, 16, 17, 18, 19, 20, 21, 22

## TW-11-03-F-D-372-SM-A
designator P?
SMT Board Stacker, Vertical, -55 to 125 degC, 2 mm Pitch, 22-Pin, Male, RoHS; Manufacturer: Samtec; PartNumber: TW-11-03-F-D-372-SM-A; Pitch: 2 mm; DatasheetVersion: F-214; PackageVersion: CL, 3/1993; PackageReference: TW-11-03-X-D-372-SM-A; PackageDescription: High Temp 2mm SMT Board Stacking Terminal Strip ASM; Orientation: Vertical; RoHS: True; Temperature Range: -55 to 125 degC; Mounting Technology: Surface Mount; ComponentLink1Description: Manufacturer URL; ComponentLink1URL: http://www.samtec.com; ComponentLink2Description: Datasheet; ComponentLink2URL: http://d2a072wq521u33.cloudfront.net/catalog_english//TW_SM.PDF; ComponentLink3Description: Package Specification; ComponentLink3URL: http://www.samtec.com/documents/webfiles/cpdf/TW-XX-XX-XXX-X-XXX-SM-XXX-XX-MKT1.pdf
footprint SMTC-TW-11-03-X-D-372-SM-A (SMT Board Stacking Terminal Strip ASM, 2x11 Pins, Vertical, 2mm Pitch, Male)
pins: 1, 2, 3, 4, 5, 6, 7, 8, 9, 10, 11, 12, 13, 14, 15, 16, 17, 18, 19, 20, 21, 22

## TW-11-03-L-D-316-SM-A
designator P?
SMT Board Stacker, Vertical, -55 to 125 degC, 2 mm Pitch, 22-Pin, Male, RoHS; Manufacturer: Samtec; PartNumber: TW-11-03-L-D-316-SM-A; Pitch: 2 mm; DatasheetVersion: F-214; PackageVersion: CL, 3/1993; PackageReference: TW-11-03-X-D-316-SM-A; PackageDescription: High Temp 2mm SMT Board Stacking Terminal Strip ASM; Orientation: Vertical; RoHS: True; Temperature Range: -55 to 125 degC; Mounting Technology: Surface Mount; ComponentLink1Description: Manufacturer URL; ComponentLink1URL: http://www.samtec.com; ComponentLink2Description: Datasheet; ComponentLink2URL: http://d2a072wq521u33.cloudfront.net/catalog_english//TW_SM.PDF; ComponentLink3Description: Package Specification; ComponentLink3URL: http://www.samtec.com/documents/webfiles/cpdf/TW-XX-XX-XXX-X-XXX-SM-XXX-XX-MKT1.pdf
footprint SMTC-TW-11-03-X-D-316-SM-A (SMT Board Stacking Terminal Strip ASM, 2x11 Pins, Vertical, 2mm Pitch, Male)
pins: 1, 2, 3, 4, 5, 6, 7, 8, 9, 10, 11, 12, 13, 14, 15, 16, 17, 18, 19, 20, 21, 22

## TW-11-03-L-D-372-SM-A
designator P?
SMT Board Stacker, Vertical, -55 to 105 degC, 2 mm Pitch, 22-Pin, Male, RoHS; Manufacturer: Samtec; PartNumber: TW-11-03-L-D-372-SM-A; Pitch: 2 mm; DatasheetVersion: F-214; PackageVersion: CL, 3/1993; PackageReference: TW-11-03-X-D-372-SM-A; PackageDescription: High Temp 2mm SMT Board Stacking Terminal Strip ASM; Orientation: Vertical; RoHS: True; Temperature Range: -55 to 105 degC; Mounting Technology: Surface Mount; ComponentLink1Description: Manufacturer URL; ComponentLink1URL: http://www.samtec.com; ComponentLink2Description: Datasheet; ComponentLink2URL: http://d2a072wq521u33.cloudfront.net/catalog_english//TW_SM.PDF; ComponentLink3Description: Package Specification; ComponentLink3URL: http://www.samtec.com/documents/webfiles/cpdf/TW-XX-XX-XXX-X-XXX-SM-XXX-XX-MKT1.pdf
footprint SMTC-TW-11-03-X-D-372-SM-A (SMT Board Stacking Terminal Strip ASM, 2x11 Pins, Vertical, 2mm Pitch, Male)
pins: 1, 2, 3, 4, 5, 6, 7, 8, 9, 10, 11, 12, 13, 14, 15, 16, 17, 18, 19, 20, 21, 22